# Altium schematic symbol library Capacitor - Ceramic - Sumsung.SchLib: 1421 symbols (part 1 of 8) (continued)
## CL03B152KP3NNNC (continued)
CAP CER 1500PF 10V X7R 0201; Part Number: CL03B152KP3NNNC; Manufacturer: Samsung Electro-Mechanics America, Inc.; TemperatureRange: -55C ~ 125C; Tolerance: 10%; Value: 1500pF; PartId: 21049; Supplier 1: Digi-Key; Supplier Part Number 1: 1276-1346-2-ND; ComponentLink1Description: Datasheet; ComponentLink1URL: http://www.samsungsem.com/kr/support/product-search/mlcc/__icsFiles/afieldfile/2016/08/18/S_CL03B152KP3NNNC.pdf; ComponentLink2Description: Digi-Key Listing; ComponentLink2URL: https://www.digikey.com/product-detail/en/samsung-electro-mechanics-america-inc/CL03B152KP3NNNC/1276-1346-2-ND/3887004; TemperatureCoefficient: X7R; Voltage: 10V; Price: 0.003; Device Package: 0201 (0603 Metric)
footprint CAP 0201/0603
pins: 1, 2

## CL03B221KA3NNNC
designator C?, comment 220pF
CAP CER 220PF 25V X7R 0201; Part Number: CL03B221KA3NNNC; Manufacturer: Samsung Electro-Mechanics America, Inc.; TemperatureRange: -55C ~ 125C; Tolerance: 10%; Value: 220pF; PartId: 21027; Supplier 1: Digi-Key; Supplier Part Number 1: 1276-1347-2-ND; ComponentLink1Description: Datasheet; ComponentLink1URL: http://www.samsungsem.com/kr/support/product-search/mlcc/__icsFiles/afieldfile/2016/08/18/S_CL03B221KA3NNNC.pdf; ComponentLink2Description: Digi-Key Listing; ComponentLink2URL: https://www.digikey.com/product-detail/en/samsung-electro-mechanics-america-inc/CL03B221KA3NNNC/1276-1347-2-ND/3887005; TemperatureCoefficient: X7R; Voltage: 25V; Price: 0.0044; Device Package: 0201 (0603 Metric)
footprint CAP 0201/0603
pins: 1, 2

## CL03B221KO3NNNC
designator C?, comment 220pF
CAP CER 220PF 16V X7R 0201; Part Number: CL03B221KO3NNNC; Manufacturer: Samsung Electro-Mechanics America, Inc.; TemperatureRange: -55C ~ 125C; Tolerance: 10%; Value: 220pF; PartId: 21076; Supplier 1: Digi-Key; Supplier Part Number 1: 1276-1348-2-ND; ComponentLink1Description: Datasheet; ComponentLink1URL: http://www.samsungsem.com/kr/support/product-search/mlcc/__icsFiles/afieldfile/2016/08/18/S_CL03B221KO3NNNC.pdf; ComponentLink2Description: Digi-Key Listing; ComponentLink2URL: https://www.digikey.com/product-detail/en/samsung-electro-mechanics-america-inc/CL03B221KO3NNNC/1276-1348-2-ND/3887006; TemperatureCoefficient: X7R; Voltage: 16V; Price: 0.0044; Device Package: 0201 (0603 Metric)
footprint CAP 0201/0603
pins: 1, 2

## CL03B222KP3NNNC
designator C?, comment 2200pF
CAP CER 2200PF 10V X7R 0201; Part Number: CL03B222KP3NNNC; Manufacturer: Samsung Electro-Mechanics America, Inc.; TemperatureRange: -55C ~ 125C; Tolerance: 10%; Value: 2200pF; PartId: 20753; Supplier 1: Digi-Key; Supplier Part Number 1: 1276-1349-2-ND; ComponentLink1Description: Datasheet; ComponentLink1URL: http://www.samsungsem.com/kr/support/product-search/mlcc/__icsFiles/afieldfile/2016/08/18/S_CL03B222KP3NNNC.pdf; ComponentLink2Description: Digi-Key Listing; ComponentLink2URL: https://www.digikey.com/product-detail/en/samsung-electro-mechanics-america-inc/CL03B222KP3NNNC/1276-1349-2-ND/3887007; TemperatureCoefficient: X7R; Voltage: 10V; Price: 0.0044; Device Package: 0201 (0603 Metric)
footprint CAP 0201/0603
pins: 1, 2

## CL03B271KO3NNNC
designator C?, comment 270pF
CAP CER 270PF 16V X7R 0201; Part Number: CL03B271KO3NNNC; Manufacturer: Samsung Electro-Mechanics America, Inc.; TemperatureRange: -55C ~ 125C; Tolerance: 10%; Value: 270pF; PartId: 21071; Supplier 1: Digi-Key; Supplier Part Number 1: 1276-1350-2-ND; ComponentLink1Description: Datasheet; ComponentLink1URL: http://www.samsungsem.com/kr/support/product-search/mlcc/__icsFiles/afieldfile/2016/08/18/S_CL03B271KO3NNNC.pdf; ComponentLink2Description: Digi-Key Listing; ComponentLink2URL: https://www.digikey.com/product-detail/en/samsung-electro-mechanics-america-inc/CL03B271KO3NNNC/1276-1350-2-ND/3887008; TemperatureCoefficient: X7R; Voltage: 16V; Price: 0.0044; Device Package: 0201 (0603 Metric)
footprint CAP 0201/0603
pins: 1, 2

## CL03B331KA3NNNC
designator C?, comment 330pF
CAP CER 330PF 25V X7R 0201; Part Number: CL03B331KA3NNNC; Manufacturer: Samsung Electro-Mechanics; TemperatureRange: -55C ~ 125C; Tolerance: 10%; Value: 330pF; PartId: 30134; Supplier 1: Digi-Key; Supplier Part Number 1: 1276-1351-2-ND; ComponentLink1Description: Datasheet; ComponentLink1URL: http://www.samsungsem.com/kr/support/product-search/mlcc/CL03B331KA3NNNC.jsp; ComponentLink2Description: Digi-Key Listing; ComponentLink2URL: https://www.digikey.com/product-detail/en/samsung-electro-mechanics/CL03B331KA3NNNC/1276-1351-2-ND/3887009; TemperatureCoefficient: X7R; Voltage: 25V; Price: 0; Device Package: 0201 (0603 Metric)
footprint CAP 0201/0603
pins: 1, 2

## CL03B331KO3NNNC
designator C?, comment 330pF
CAP CER 330PF 16V X7R 0201; Part Number: CL03B331KO3NNNC; Manufacturer: Samsung Electro-Mechanics America, Inc.; TemperatureRange: -55C ~ 125C; Tolerance: 10%; Value: 330pF; PartId: 21068; Supplier 1: Digi-Key; Supplier Part Number 1: 1276-1352-2-ND; ComponentLink1Description: Datasheet; ComponentLink1URL: http://www.samsungsem.com/kr/support/product-search/mlcc/__icsFiles/afieldfile/2016/08/18/S_CL03B331KO3NNNC.pdf; ComponentLink2Description: Digi-Key Listing; ComponentLink2URL: https://www.digikey.com/product-detail/en/samsung-electro-mechanics-america-inc/CL03B331KO3NNNC/1276-1352-2-ND/3887010; TemperatureCoefficient: X7R; Voltage: 16V; Price: 0.0039; Device Package: 0201 (0603 Metric)
footprint CAP 0201/0603
pins: 1, 2

## CL03B471KO3NNNC
designator C?, comment 470pF
CAP CER 470PF 16V X7R 0201; Part Number: CL03B471KO3NNNC; Manufacturer: Samsung Electro-Mechanics America, Inc.; TemperatureRange: -55C ~ 125C; Tolerance: 10%; Value: 470pF; PartId: 20754; Supplier 1: Digi-Key; Supplier Part Number 1: 1276-1354-2-ND; ComponentLink1Description: Datasheet; ComponentLink1URL: http://www.samsungsem.com/kr/support/product-search/mlcc/__icsFiles/afieldfile/2016/08/18/S_CL03B471KO3NNNC.pdf; ComponentLink2Description: Digi-Key Listing; ComponentLink2URL: https://www.digikey.com/product-detail/en/samsung-electro-mechanics-america-inc/CL03B471KO3NNNC/1276-1354-2-ND/3887012; TemperatureCoefficient: X7R; Voltage: 16V; Price: 0.0044; Device Package: 0201 (0603 Metric)
footprint CAP 0201/0603
pins: 1, 2

## CL03B472KP3NNNC
designator C?, comment 4700pF
CAP CER 4700PF 10V X7R 0201; Part Number: CL03B472KP3NNNC; Manufacturer: Samsung Electro-Mechanics America, Inc.; TemperatureRange: -55C ~ 125C; Tolerance: 10%; Value: 4700pF; PartId: 20755; Supplier 1: Digi-Key; Supplier Part Number 1: 1276-1355-2-ND; ComponentLink1Description: Datasheet; ComponentLink1URL: http://www.samsungsem.com/kr/support/product-search/mlcc/__icsFiles/afieldfile/2016/08/18/S_CL03B472KP3NNNC.pdf; ComponentLink2Description: Digi-Key Listing; ComponentLink2URL: https://www.digikey.com/product-detail/en/samsung-electro-mechanics-america-inc/CL03B472KP3NNNC/1276-1355-2-ND/3887013; TemperatureCoefficient: X7R; Voltage: 10V; Price: 0.0044; Device Package: 0201 (0603 Metric)
footprint CAP 0201/0603
pins: 1, 2

## CL03B472KQ3NNNC
designator C?, comment 4700pF
CAP CER 4700PF 6.3V X7R 0201; Part Number: CL03B472KQ3NNNC; Manufacturer: Samsung Electro-Mechanics America, Inc.; TemperatureRange: -55C ~ 125C; Tolerance: 10%; Value: 4700pF; PartId: 21053; Supplier 1: Digi-Key; Supplier Part Number 1: 1276-1356-2-ND; ComponentLink1Description: Datasheet; ComponentLink1URL: http://www.samsungsem.com/kr/support/product-search/mlcc/__icsFiles/afieldfile/2016/08/18/S_CL03B472KQ3NNNC.pdf; ComponentLink2Description: Digi-Key Listing; ComponentLink2URL: https://www.digikey.com/product-detail/en/samsung-electro-mechanics-america-inc/CL03B472KQ3NNNC/1276-1356-2-ND/3887014; TemperatureCoefficient: X7R; Voltage: 6.3V; Price: 0.0036; Device Package: 0201 (0603 Metric)
footprint CAP 0201/0603
pins: 1, 2

## CL03B561KO3NNNC
designator C?, comment 560pF
CAP CER 560PF 16V X7R 0201; Part Number: CL03B561KO3NNNC; Manufacturer: Samsung Electro-Mechanics America, Inc.; TemperatureRange: -55C ~ 125C; Tolerance: 10%; Value: 560pF; PartId: 20606; Supplier 1: Digi-Key; Supplier Part Number 1: 1276-1357-2-ND; ComponentLink1Description: Datasheet; ComponentLink1URL: http://www.samsungsem.com/kr/support/product-search/mlcc/__icsFiles/afieldfile/2016/08/18/S_CL03B561KO3NNNC.pdf; ComponentLink2Description: Digi-Key Listing; ComponentLink2URL: https://www.digikey.com/product-detail/en/samsung-electro-mechanics-america-inc/CL03B561KO3NNNC/1276-1357-2-ND/3887015; TemperatureCoefficient: X7R; Voltage: 16V; Price: 0.0044; Device Package: 0201 (0603 Metric)
footprint CAP 0201/0603
pins: 1, 2

## CL03B682KP3NNNC
designator C?, comment 6800pF
CAP CER 6800PF 10V X7R 0201; Part Number: CL03B682KP3NNNC; Manufacturer: Samsung Electro-Mechanics America, Inc.; TemperatureRange: -55C ~ 125C; Tolerance: 10%; Value: 6800pF; PartId: 21069; Supplier 1: Digi-Key; Supplier Part Number 1: 1276-1358-2-ND; ComponentLink1Description: Datasheet; ComponentLink1URL: http://www.samsungsem.com/kr/support/product-search/mlcc/__icsFiles/afieldfile/2016/08/18/S_CL03B682KP3NNNC.pdf; ComponentLink2Description: Digi-Key Listing; ComponentLink2URL: https://www.digikey.com/product-detail/en/samsung-electro-mechanics-america-inc/CL03B682KP3NNNC/1276-1358-2-ND/3887016; TemperatureCoefficient: X7R; Voltage: 10V; Price: 0.0044; Device Package: 0201 (0603 Metric)
footprint CAP 0201/0603
pins: 1, 2

## CL03B821KO3NNNC
designator C?, comment 820pF
CAP CER 820PF 16V X7R 0201; Part Number: CL03B821KO3NNNC; Manufacturer: Samsung Electro-Mechanics America, Inc.; TemperatureRange: -55C ~ 125C; Tolerance: 10%; Value: 820pF; PartId: 20756; Supplier 1: Digi-Key; Supplier Part Number 1: 1276-1360-2-ND; ComponentLink1Description: Datasheet; ComponentLink1URL: http://www.samsungsem.com/kr/support/product-search/mlcc/__icsFiles/afieldfile/2016/08/18/S_CL03B821KO3NNNC.pdf; ComponentLink2Description: Digi-Key Listing; ComponentLink2URL: https://www.digikey.com/product-detail/en/samsung-electro-mechanics-america-inc/CL03B821KO3NNNC/1276-1360-2-ND/3887018; TemperatureCoefficient: X7R; Voltage: 16V; Price: 0.0044; Device Package: 0201 (0603 Metric)
footprint CAP 0201/0603
pins: 1, 2

## CL03C0R3BA3GNNC
designator C?, comment 0.30pF
CAP CER 0.3PF 25V NP0 0201; Part Number: CL03C0R3BA3GNNC; Manufacturer: Samsung Electro-Mechanics America, Inc.; TemperatureRange: -55C ~ 125C; TemperatureCoefficient: C0G, NP0; Tolerance: 0.1pF; Value: 0.30pF; PartId: 20786; Supplier 1: Digi-Key; Supplier Part Number 1: 1276-1375-2-ND; ComponentLink1Description: Datasheet; ComponentLink1URL: http://www.samsungsem.com/kr/support/product-search/mlcc/__icsFiles/afieldfile/2016/08/18/S_CL03C0R3BA3GNNC.pdf; ComponentLink2Description: Digi-Key Listing; ComponentLink2URL: https://www.digikey.com/product-detail/en/samsung-electro-mechanics-america-inc/CL03C0R3BA3GNNC/1276-1375-2-ND/3887033; Voltage: 25V; Price: 0.0063; Device Package: 0201 (0603 Metric)
footprint CAP 0201/0603
pins: 1, 2

## CL03C0R4BA3GNNC
designator C?, comment 0.40pF
CAP CER 0.4PF 25V NP0 0201; Part Number: CL03C0R4BA3GNNC; Manufacturer: Samsung Electro-Mechanics America, Inc.; TemperatureRange: -55C ~ 125C; TemperatureCoefficient: C0G, NP0; Tolerance: 0.1pF; Value: 0.40pF; PartId: 21061; Supplier 1: Digi-Key; Supplier Part Number 1: 1276-1376-2-ND; ComponentLink1Description: Datasheet; ComponentLink1URL: http://www.samsungsem.com/kr/support/product-search/mlcc/__icsFiles/afieldfile/2016/08/18/S_CL03C0R4BA3GNNC.pdf; ComponentLink2Description: Digi-Key Listing; ComponentLink2URL: https://www.digikey.com/product-detail/en/samsung-electro-mechanics-america-inc/CL03C0R4BA3GNNC/1276-1376-2-ND/3887034; Voltage: 25V; Price: 0.0063; Device Package: 0201 (0603 Metric)
footprint CAP 0201/0603
pins: 1, 2

## CL03C0R5BA3GNNC
designator C?, comment 0.50pF
CAP CER 0.5PF 25V NP0 0201; Part Number: CL03C0R5BA3GNNC; Manufacturer: Samsung Electro-Mechanics America, Inc.; TemperatureRange: -55C ~ 125C; TemperatureCoefficient: C0G, NP0; Tolerance: 0.1pF; Value: 0.50pF; PartId: 20787; Supplier 1: Digi-Key; Supplier Part Number 1: 1276-1377-2-ND; ComponentLink1Description: Datasheet; ComponentLink1URL: http://www.samsungsem.com/kr/support/product-search/mlcc/__icsFiles/afieldfile/2016/08/18/S_CL03C0R5BA3GNNC.pdf; ComponentLink2Description: Digi-Key Listing; ComponentLink2URL: https://www.digikey.com/product-detail/en/samsung-electro-mechanics-america-inc/CL03C0R5BA3GNNC/1276-1377-2-ND/3887035; Voltage: 25V; Price: 0.0063; Device Package: 0201 (0603 Metric)
footprint CAP 0201/0603
pins: 1, 2

## CL03C0R5CA3GNNC
designator C?, comment 0.50pF
CAP CER 0.5PF 25V NP0 0201; Part Number: CL03C0R5CA3GNNC; Manufacturer: Samsung Electro-Mechanics America, Inc.; TemperatureRange: -55C ~ 125C; TemperatureCoefficient: C0G, NP0; Tolerance: 0.25pF; Value: 0.50pF; PartId: 21040; Supplier 1: Digi-Key; Supplier Part Number 1: 1276-6543-2-ND; ComponentLink1Description: Datasheet; ComponentLink1URL: http://www.samsungsem.com/kr/support/product-search/mlcc/__icsFiles/afieldfile/2016/08/18/S_CL03C0R5CA3GNNC.pdf; ComponentLink2Description: Digi-Key Listing; ComponentLink2URL: https://www.digikey.com/product-detail/en/samsung-electro-mechanics-america-inc/CL03C0R5CA3GNNC/1276-6543-2-ND/5961027; Voltage: 25V; Price: 0.0018; Device Package: 0201 (0603 Metric)
footprint CAP 0201/0603
pins: 1, 2

## CL03C0R6BA3GNNC
designator C?, comment 0.60pF
CAP CER 0.6PF 25V NP0 0201; Part Number: CL03C0R6BA3GNNC; Manufacturer: Samsung Electro-Mechanics America, Inc.; TemperatureRange: -55C ~ 125C; TemperatureCoefficient: C0G, NP0; Tolerance: 0.1pF; Value: 0.60pF; PartId: 20788; Supplier 1: Digi-Key; Supplier Part Number 1: 1276-1378-2-ND; ComponentLink1Description: Datasheet; ComponentLink1URL: http://www.samsungsem.com/kr/support/product-search/mlcc/__icsFiles/afieldfile/2016/08/18/S_CL03C0R6BA3GNNC.pdf; ComponentLink2Description: Digi-Key Listing; ComponentLink2URL: https://www.digikey.com/product-detail/en/samsung-electro-mechanics-america-inc/CL03C0R6BA3GNNC/1276-1378-2-ND/3887036; Voltage: 25V; Price: 0.0063; Device Package: 0201 (0603 Metric)
footprint CAP 0201/0603
pins: 1, 2

## CL03C0R7BA3GNNC
designator C?, comment 0.70pF
CAP CER 0.7PF 25V NP0 0201; Part Number: CL03C0R7BA3GNNC; Manufacturer: Samsung Electro-Mechanics America, Inc.; TemperatureRange: -55C ~ 125C; TemperatureCoefficient: C0G, NP0; Tolerance: 0.1pF; Value: 0.70pF; PartId: 21052; Supplier 1: Digi-Key; Supplier Part Number 1: 1276-1379-2-ND; ComponentLink1Description: Datasheet; ComponentLink1URL: http://www.samsungsem.com/kr/support/product-search/mlcc/__icsFiles/afieldfile/2016/08/18/S_CL03C0R7BA3GNNC.pdf; ComponentLink2Description: Digi-Key Listing; ComponentLink2URL: https://www.digikey.com/product-detail/en/samsung-electro-mechanics-america-inc/CL03C0R7BA3GNNC/1276-1379-2-ND/3887037; Voltage: 25V; Price: 0.0063; Device Package: 0201 (0603 Metric)
footprint CAP 0201/0603
pins: 1, 2

## CL03C0R8CA3GNNC
designator C?, comment 0.80pF
CAP CER 0.8PF 25V NP0 0201; Part Number: CL03C0R8CA3GNNC; Manufacturer: Samsung Electro-Mechanics America, Inc.; TemperatureRange: -55C ~ 125C; TemperatureCoefficient: C0G, NP0; Tolerance: 0.25pF; Value: 0.80pF; PartId: 21066; Supplier 1: Digi-Key; Supplier Part Number 1: 1276-1381-2-ND; ComponentLink1Description: Datasheet; ComponentLink1URL: http://www.samsungsem.com/kr/support/product-search/mlcc/__icsFiles/afieldfile/2016/08/18/S_CL03C0R8CA3GNNC.pdf; ComponentLink2Description: Digi-Key Listing; ComponentLink2URL: https://www.digikey.com/product-detail/en/samsung-electro-mechanics-america-inc/CL03C0R8CA3GNNC/1276-1381-2-ND/3887039; Voltage: 25V; Price: 0.0033; Device Package: 0201 (0603 Metric)
footprint CAP 0201/0603
pins: 1, 2

## CL03C0R9BA3GNNC
designator C?, comment 0.90pF
CAP CER 0.9PF 25V NP0 0201; Part Number: CL03C0R9BA3GNNC; Manufacturer: Samsung Electro-Mechanics America, Inc.; TemperatureRange: -55C ~ 125C; TemperatureCoefficient: C0G, NP0; Tolerance: 0.1pF; Value: 0.90pF; PartId: 21050; Supplier 1: Digi-Key; Supplier Part Number 1: 1276-1382-2-ND; ComponentLink1Description: Datasheet; ComponentLink1URL: http://www.samsungsem.com/kr/support/product-search/mlcc/__icsFiles/afieldfile/2016/08/18/S_CL03C0R9BA3GNNC.pdf; ComponentLink2Description: Digi-Key Listing; ComponentLink2URL: https://www.digikey.com/product-detail/en/samsung-electro-mechanics-america-inc/CL03C0R9BA3GNNC/1276-1382-2-ND/3887040; Voltage: 25V; Price: 0.0063; Device Package: 0201 (0603 Metric)
footprint CAP 0201/0603
pins: 1, 2

## CL03C1R1BA3GNNC
designator C?, comment 1.1pF
CAP CER 1.1PF 25V C0G/NP0 0201; Part Number: CL03C1R1BA3GNNC; Manufacturer: Samsung Electro-Mechanics; TemperatureRange: -55C ~ 125C; TemperatureCoefficient: C0G, NP0; Tolerance: 0.1pF; Value: 1.1pF; PartId: 30087; Supplier 1: Digi-Key; Supplier Part Number 1: 1276-6502-2-ND; ComponentLink1Description: Datasheet; ComponentLink1URL: http://www.samsungsem.com/kr/support/product-search/mlcc/CL03C1R1BA3GNNC.jsp; ComponentLink2Description: Digi-Key Listing; ComponentLink2URL: https://www.digikey.com/product-detail/en/samsung-electro-mechanics/CL03C1R1BA3GNNC/1276-6502-2-ND/5960986; Voltage: 25V; Price: 0; Device Package: 0201 (0603 Metric)
footprint CAP 0201/0603
pins: 1, 2

## CL03C1R2BA3GNNC
designator C?, comment 1.2pF
CAP CER 1.2PF 25V NP0 0201; Part Number: CL03C1R2BA3GNNC; Manufacturer: Samsung Electro-Mechanics America, Inc.; TemperatureRange: -55C ~ 125C; TemperatureCoefficient: C0G, NP0; Tolerance: 0.1pF; Value: 1.2pF; PartId: 21060; Supplier 1: Digi-Key; Supplier Part Number 1: 1276-1392-2-ND; ComponentLink1Description: Datasheet; ComponentLink1URL: http://www.samsungsem.com/kr/support/product-search/mlcc/__icsFiles/afieldfile/2016/08/18/S_CL03C1R2BA3GNNC.pdf; ComponentLink2Description: Digi-Key Listing; ComponentLink2URL: https://www.digikey.com/product-detail/en/samsung-electro-mechanics-america-inc/CL03C1R2BA3GNNC/1276-1392-2-ND/3887050; Voltage: 25V; Price: 0.0063; Device Package: 0201 (0603 Metric)
footprint CAP 0201/0603
pins: 1, 2

## CL03C1R2CA3GNNC
designator C?, comment 1.2pF
CAP CER 1.2PF 25V NP0 0201; Part Number: CL03C1R2CA3GNNC; Manufacturer: Samsung Electro-Mechanics America, Inc.; TemperatureRange: -55C ~ 125C; TemperatureCoefficient: C0G, NP0; Tolerance: 0.25pF; Value: 1.2pF; PartId: 20733; Supplier 1: Digi-Key; Supplier Part Number 1: 1276-1393-2-ND; ComponentLink1Description: Datasheet; ComponentLink1URL: http://www.samsungsem.com/kr/support/product-search/mlcc/__icsFiles/afieldfile/2016/08/18/S_CL03C1R2CA3GNNC.pdf; ComponentLink2Description: Digi-Key Listing; ComponentLink2URL: https://www.digikey.com/product-detail/en/samsung-electro-mechanics-america-inc/CL03C1R2CA3GNNC/1276-1393-2-ND/3887051; Voltage: 25V; Price: 0.0039; Device Package: 0201 (0603 Metric)
footprint CAP 0201/0603
pins: 1, 2

## CL03C1R3BA3GNNC
designator C?, comment 1.3pF
CAP CER 1.3PF 25V NP0 0201; Part Number: CL03C1R3BA3GNNC; Manufacturer: Samsung Electro-Mechanics America, Inc.; TemperatureRange: -55C ~ 125C; TemperatureCoefficient: C0G, NP0; Tolerance: 0.1pF; Value: 1.3pF; PartId: 21073; Supplier 1: Digi-Key; Supplier Part Number 1: 1276-1394-2-ND; ComponentLink1Description: Datasheet; ComponentLink1URL: http://www.samsungsem.com/kr/support/product-search/mlcc/__icsFiles/afieldfile/2016/08/18/S_CL03C1R3BA3GNNC.pdf; ComponentLink2Description: Digi-Key Listing; ComponentLink2URL: https://www.digikey.com/product-detail/en/samsung-electro-mechanics-america-inc/CL03C1R3BA3GNNC/1276-1394-2-ND/3887052; Voltage: 25V; Price: 0.0063; Device Package: 0201 (0603 Metric)
footprint CAP 0201/0603
pins: 1, 2

## CL03C1R5BA3GNNC
designator C?, comment 1.5pF
CAP CER 1.5PF 25V NP0 0201; Part Number: CL03C1R5BA3GNNC; Manufacturer: Samsung Electro-Mechanics America, Inc.; TemperatureRange: -55C ~ 125C; TemperatureCoefficient: C0G, NP0; Tolerance: 0.1pF; Value: 1.5pF; PartId: 20789; Supplier 1: Digi-Key; Supplier Part Number 1: 1276-1395-2-ND; ComponentLink1Description: Datasheet; ComponentLink1URL: http://www.samsungsem.com/kr/support/product-search/mlcc/__icsFiles/afieldfile/2016/08/18/S_CL03C1R5BA3GNNC.pdf; ComponentLink2Description: Digi-Key Listing; ComponentLink2URL: https://www.digikey.com/product-detail/en/samsung-electro-mechanics-america-inc/CL03C1R5BA3GNNC/1276-1395-2-ND/3887053; Voltage: 25V; Price: 0.0063; Device Package: 0201 (0603 Metric)
footprint CAP 0201/0603
pins: 1, 2

## CL03C1R5CA3GNNC
designator C?, comment 1.5pF
CAP CER 1.5PF 25V NP0 0201; Part Number: CL03C1R5CA3GNNC; Manufacturer: Samsung Electro-Mechanics America, Inc.; TemperatureRange: -55C ~ 125C; TemperatureCoefficient: C0G, NP0; Tolerance: 0.25pF; Value: 1.5pF; PartId: 21086; Supplier 1: Digi-Key; Supplier Part Number 1: 1276-1396-2-ND; ComponentLink1Description: Datasheet; ComponentLink1URL: http://www.samsungsem.com/kr/support/product-search/mlcc/__icsFiles/afieldfile/2016/08/18/S_CL03C1R5CA3GNNC.pdf; ComponentLink2Description: Digi-Key Listing; ComponentLink2URL: https://www.digikey.com/product-detail/en/samsung-electro-mechanics-america-inc/CL03C1R5CA3GNNC/1276-1396-2-ND/3887054; Voltage: 25V; Price: 0.0039; Device Package: 0201 (0603 Metric)
footprint CAP 0201/0603
pins: 1, 2

## CL03C1R8BA3GNNC
designator C?, comment 1.8pF
CAP CER 1.8PF 25V NP0 0201; Part Number: CL03C1R8BA3GNNC; Manufacturer: Samsung Electro-Mechanics America, Inc.; TemperatureRange: -55C ~ 125C; TemperatureCoefficient: C0G, NP0; Tolerance: 0.1pF; Value: 1.8pF; PartId: 21044; Supplier 1: Digi-Key; Supplier Part Number 1: 1276-1399-2-ND; ComponentLink1Description: Datasheet; ComponentLink1URL: http://www.samsungsem.com/kr/support/product-search/mlcc/__icsFiles/afieldfile/2016/08/18/S_CL03C1R8BA3GNNC.pdf; ComponentLink2Description: Digi-Key Listing; ComponentLink2URL: https://www.digikey.com/product-detail/en/samsung-electro-mechanics-america-inc/CL03C1R8BA3GNNC/1276-1399-2-ND/3887057; Voltage: 25V; Price: 0.0063; Device Package: 0201 (0603 Metric)
footprint CAP 0201/0603
pins: 1, 2

## CL03C1R8CA3GNNC
designator C?, comment 1.8pF
CAP CER 1.8PF 25V NP0 0201; Part Number: CL03C1R8CA3GNNC; Manufacturer: Samsung Electro-Mechanics America, Inc.; TemperatureRange: -55C ~ 125C; TemperatureCoefficient: C0G, NP0; Tolerance: 0.25pF; Value: 1.8pF; PartId: 21051; Supplier 1: Digi-Key; Supplier Part Number 1: 1276-1400-2-ND; ComponentLink1Description: Datasheet; ComponentLink1URL: http://www.samsungsem.com/kr/support/product-search/mlcc/__icsFiles/afieldfile/2016/08/18/S_CL03C1R8CA3GNNC.pdf; ComponentLink2Description: Digi-Key Listing; ComponentLink2URL: https://www.digikey.com/product-detail/en/samsung-electro-mechanics-america-inc/CL03C1R8CA3GNNC/1276-1400-2-ND/3887058; Voltage: 25V; Price: 0.0039; Device Package: 0201 (0603 Metric)
footprint CAP 0201/0603
pins: 1, 2

## CL03C2R2BA3GNNC
designator C?, comment 2.2pF
CAP CER 2.2PF 25V NP0 0201; Part Number: CL03C2R2BA3GNNC; Manufacturer: Samsung Electro-Mechanics America, Inc.; TemperatureRange: -55C ~ 125C; TemperatureCoefficient: C0G, NP0; Tolerance: 0.1pF; Value: 2.2pF; PartId: 21083; Supplier 1: Digi-Key; Supplier Part Number 1: 1276-1403-2-ND; ComponentLink1Description: Datasheet; ComponentLink1URL: http://www.samsungsem.com/kr/support/product-search/mlcc/__icsFiles/afieldfile/2016/08/18/S_CL03C2R2BA3GNNC.pdf; ComponentLink2Description: Digi-Key Listing; ComponentLink2URL: https://www.digikey.com/product-detail/en/samsung-electro-mechanics-america-inc/CL03C2R2BA3GNNC/1276-1403-2-ND/3887061; Voltage: 25V; Price: 0.0063; Device Package: 0201 (0603 Metric)
footprint CAP 0201/0603
pins: 1, 2

## CL03C2R2BA3GNNH
designator C?, comment 2.2pF
CAP CER 2.2PF 25V NP0 0201; Part Number: CL03C2R2BA3GNNH; Manufacturer: Samsung Electro-Mechanics America, Inc.; TemperatureRange: -55C ~ 125C; TemperatureCoefficient: C0G, NP0; Tolerance: 0.1pF; Value: 2.2pF; PartId: 20988; Supplier 1: Digi-Key; Supplier Part Number 1: 1276-6449-2-ND; ComponentLink1Description: Datasheet; ComponentLink1URL: http://www.samsungsem.com/kr/support/product-search/mlcc/__icsFiles/afieldfile/2016/08/18/S_CL03C2R2BA3GNNH.pdf; ComponentLink2Description: Digi-Key Listing; ComponentLink2URL: https://www.digikey.com/product-detail/en/samsung-electro-mechanics-america-inc/CL03C2R2BA3GNNH/1276-6449-2-ND/3894150; Voltage: 25V; Price: 0.0034; Device Package: 0201 (0603 Metric)
footprint CAP 0201/0603
pins: 1, 2

## CL03C2R2CA3GNNC
designator C?, comment 2.2pF
CAP CER 2.2PF 25V NP0 0201; Part Number: CL03C2R2CA3GNNC; Manufacturer: Samsung Electro-Mechanics America, Inc.; TemperatureRange: -55C ~ 125C; TemperatureCoefficient: C0G, NP0; Tolerance: 0.25pF; Value: 2.2pF; PartId: 20734; Supplier 1: Digi-Key; Supplier Part Number 1: 1276-1404-2-ND; ComponentLink1Description: Datasheet; ComponentLink1URL: http://www.samsungsem.com/kr/support/product-search/mlcc/__icsFiles/afieldfile/2016/08/18/S_CL03C2R2CA3GNNC.pdf; ComponentLink2Description: Digi-Key Listing; ComponentLink2URL: https://www.digikey.com/product-detail/en/samsung-electro-mechanics-america-inc/CL03C2R2CA3GNNC/1276-1404-2-ND/3887062; Voltage: 25V; Price: 0.0039; Device Package: 0201 (0603 Metric)
footprint CAP 0201/0603
pins: 1, 2

## CL03C2R4BA3GNNC
designator C?, comment 2.4pF
CAP CER 2.4PF 25V NP0 0201; Part Number: CL03C2R4BA3GNNC; Manufacturer: Samsung Electro-Mechanics America, Inc.; TemperatureRange: -55C ~ 125C; TemperatureCoefficient: C0G, NP0; Tolerance: 0.1pF; Value: 2.4pF; PartId: 21077; Supplier 1: Digi-Key; Supplier Part Number 1: 1276-1405-2-ND; ComponentLink1Description: Datasheet; ComponentLink1URL: http://www.samsungsem.com/kr/support/product-search/mlcc/__icsFiles/afieldfile/2016/08/18/S_CL03C2R4BA3GNNC.pdf; ComponentLink2Description: Digi-Key Listing; ComponentLink2URL: https://www.digikey.com/product-detail/en/samsung-electro-mechanics-america-inc/CL03C2R4BA3GNNC/1276-1405-2-ND/3887063; Voltage: 25V; Price: 0.0063; Device Package: 0201 (0603 Metric)
footprint CAP 0201/0603
pins: 1, 2

## CL03C2R4CA3GNNC
designator C?, comment 2.4pF
CAP CER 2.4PF 25V NP0 0201; Part Number: CL03C2R4CA3GNNC; Manufacturer: Samsung Electro-Mechanics America, Inc.; TemperatureRange: -55C ~ 125C; TemperatureCoefficient: C0G, NP0; Tolerance: 0.25pF; Value: 2.4pF; PartId: 21055; Supplier 1: Digi-Key; Supplier Part Number 1: 1276-1406-2-ND; ComponentLink1Description: Datasheet; ComponentLink1URL: http://www.samsungsem.com/kr/support/product-search/mlcc/__icsFiles/afieldfile/2016/08/18/S_CL03C2R4CA3GNNC.pdf; ComponentLink2Description: Digi-Key Listing; ComponentLink2URL: https://www.digikey.com/product-detail/en/samsung-electro-mechanics-america-inc/CL03C2R4CA3GNNC/1276-1406-2-ND/3887064; Voltage: 25V; Price: 0.0033; Device Package: 0201 (0603 Metric)
footprint CAP 0201/0603
pins: 1, 2

## CL03C2R6BA3GNNC
designator C?, comment 2.6pF
CAP CER 2.6PF 25V NP0 0201; Part Number: CL03C2R6BA3GNNC; Manufacturer: Samsung Electro-Mechanics America, Inc.; TemperatureRange: -55C ~ 125C; TemperatureCoefficient: C0G, NP0; Tolerance: 0.1pF; Value: 2.6pF; PartId: 21080; Supplier 1: Digi-Key; Supplier Part Number 1: 1276-6623-2-ND; ComponentLink1Description: Datasheet; ComponentLink1URL: http://www.samsungsem.com/kr/support/product-search/mlcc/__icsFiles/afieldfile/2016/08/18/S_CL03C2R6BA3GNNC.pdf; ComponentLink2Description: Digi-Key Listing; ComponentLink2URL: https://www.digikey.com/product-detail/en/samsung-electro-mechanics-america-inc/CL03C2R6BA3GNNC/1276-6623-2-ND/5961107; Voltage: 25V; Price: 0.0039; Device Package: 0201 (0603 Metric)
footprint CAP 0201/0603
pins: 1, 2

## CL03C2R7BA3GNNC
designator C?, comment 2.7pF
CAP CER 2.7PF 25V NP0 0201; Part Number: CL03C2R7BA3GNNC; Manufacturer: Samsung Electro-Mechanics America, Inc.; TemperatureRange: -55C ~ 125C; TemperatureCoefficient: C0G, NP0; Tolerance: 0.1pF; Value: 2.7pF; PartId: 21028; Supplier 1: Digi-Key; Supplier Part Number 1: 1276-1407-2-ND; ComponentLink1Description: Datasheet; ComponentLink1URL: http://www.samsungsem.com/kr/support/product-search/mlcc/__icsFiles/afieldfile/2016/08/18/S_CL03C2R7BA3GNNC.pdf; ComponentLink2Description: Digi-Key Listing; ComponentLink2URL: https://www.digikey.com/product-detail/en/samsung-electro-mechanics-america-inc/CL03C2R7BA3GNNC/1276-1407-2-ND/3887065; Voltage: 25V; Price: 0.0063; Device Package: 0201 (0603 Metric)
footprint CAP 0201/0603
pins: 1, 2

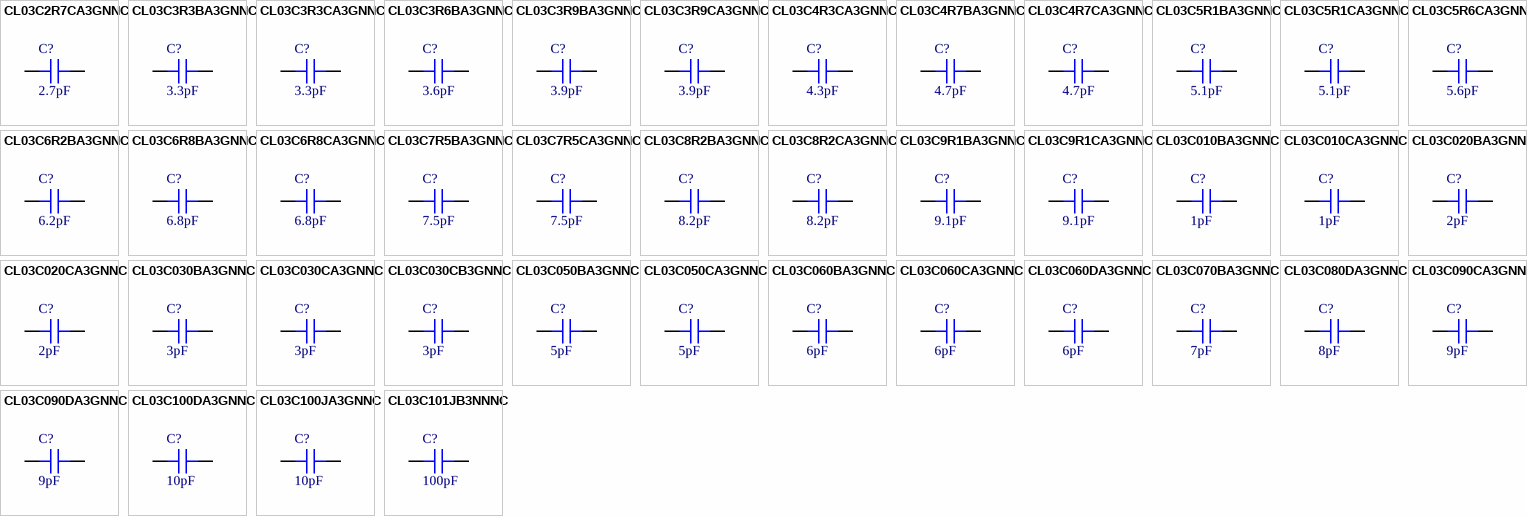
[diagram p2: symbols CL03C2R7CA3GNNC to CL03C101JB3NNNC]

## CL03C2R7CA3GNNC
designator C?, comment 2.7pF
CAP CER 2.7PF 25V NP0 0201; Part Number: CL03C2R7CA3GNNC; Manufacturer: Samsung Electro-Mechanics America, Inc.; TemperatureRange: -55C ~ 125C; TemperatureCoefficient: C0G, NP0; Tolerance: 0.25pF; Value: 2.7pF; PartId: 20730; Supplier 1: Digi-Key; Supplier Part Number 1: 1276-1408-2-ND; ComponentLink1Description: Datasheet; ComponentLink1URL: http://www.samsungsem.com/kr/support/product-search/mlcc/__icsFiles/afieldfile/2016/08/18/S_CL03C2R7CA3GNNC.pdf; ComponentLink2Description: Digi-Key Listing; ComponentLink2URL: https://www.digikey.com/product-detail/en/samsung-electro-mechanics-america-inc/CL03C2R7CA3GNNC/1276-1408-2-ND/3887066; Voltage: 25V; Price: 0.0039; Device Package: 0201 (0603 Metric)
footprint CAP 0201/0603
pins: 1, 2

## CL03C3R3BA3GNNC
designator C?, comment 3.3pF
CAP CER 3.3PF 25V C0G/NP0 0201; Part Number: CL03C3R3BA3GNNC; Manufacturer: Samsung Electro-Mechanics; TemperatureRange: -55C ~ 125C; TemperatureCoefficient: C0G, NP0; Tolerance: 0.1pF; Value: 3.3pF; PartId: 30158; Supplier 1: Digi-Key; Supplier Part Number 1: 1276-1411-2-ND; ComponentLink1Description: Datasheet; ComponentLink1URL: http://www.samsungsem.com/kr/support/product-search/mlcc/CL03C3R3BA3GNNC.jsp; ComponentLink2Description: Digi-Key Listing; ComponentLink2URL: https://www.digikey.com/product-detail/en/samsung-electro-mechanics/CL03C3R3BA3GNNC/1276-1411-2-ND/3887069; Voltage: 25V; Price: 0; Device Package: 0201 (0603 Metric)
footprint CAP 0201/0603
pins: 1, 2

## CL03C3R3CA3GNNC
designator C?, comment 3.3pF
CAP CER 3.3PF 25V NP0 0201; Part Number: CL03C3R3CA3GNNC; Manufacturer: Samsung Electro-Mechanics America, Inc.; TemperatureRange: -55C ~ 125C; TemperatureCoefficient: C0G, NP0; Tolerance: 0.25pF; Value: 3.3pF; PartId: 21084; Supplier 1: Digi-Key; Supplier Part Number 1: 1276-1412-2-ND; ComponentLink1Description: Datasheet; ComponentLink1URL: http://www.samsungsem.com/kr/support/product-search/mlcc/__icsFiles/afieldfile/2016/08/18/S_CL03C3R3CA3GNNC.pdf; ComponentLink2Description: Digi-Key Listing; ComponentLink2URL: https://www.digikey.com/product-detail/en/samsung-electro-mechanics-america-inc/CL03C3R3CA3GNNC/1276-1412-2-ND/3887070; Voltage: 25V; Price: 0.0039; Device Package: 0201 (0603 Metric)
footprint CAP 0201/0603
pins: 1, 2

## CL03C3R6BA3GNNC
designator C?, comment 3.6pF
CAP CER 3.6PF 25V NP0 0201; Part Number: CL03C3R6BA3GNNC; Manufacturer: Samsung Electro-Mechanics America, Inc.; TemperatureRange: -55C ~ 125C; TemperatureCoefficient: C0G, NP0; Tolerance: 0.1pF; Value: 3.6pF; PartId: 21065; Supplier 1: Digi-Key; Supplier Part Number 1: 1276-1413-2-ND; ComponentLink1Description: Datasheet; ComponentLink1URL: http://www.samsungsem.com/kr/support/product-search/mlcc/__icsFiles/afieldfile/2016/08/18/S_CL03C3R6BA3GNNC.pdf; ComponentLink2Description: Digi-Key Listing; ComponentLink2URL: https://www.digikey.com/product-detail/en/samsung-electro-mechanics-america-inc/CL03C3R6BA3GNNC/1276-1413-2-ND/3887071; Voltage: 25V; Price: 0.0063; Device Package: 0201 (0603 Metric)
footprint CAP 0201/0603
pins: 1, 2

## CL03C3R9BA3GNNC
designator C?, comment 3.9pF
CAP CER 3.9PF 25V NP0 0201; Part Number: CL03C3R9BA3GNNC; Manufacturer: Samsung Electro-Mechanics America, Inc.; TemperatureRange: -55C ~ 125C; TemperatureCoefficient: C0G, NP0; Tolerance: 0.1pF; Value: 3.9pF; PartId: 20790; Supplier 1: Digi-Key; Supplier Part Number 1: 1276-1416-2-ND; ComponentLink1Description: Datasheet; ComponentLink1URL: http://www.samsungsem.com/kr/support/product-search/mlcc/__icsFiles/afieldfile/2016/08/18/S_CL03C3R9BA3GNNC.pdf; ComponentLink2Description: Digi-Key Listing; ComponentLink2URL: https://www.digikey.com/product-detail/en/samsung-electro-mechanics-america-inc/CL03C3R9BA3GNNC/1276-1416-2-ND/3887074; Voltage: 25V; Price: 0.0063; Device Package: 0201 (0603 Metric)
footprint CAP 0201/0603
pins: 1, 2

## CL03C3R9CA3GNNC
designator C?, comment 3.9pF
CAP CER 3.9PF 25V NP0 0201; Part Number: CL03C3R9CA3GNNC; Manufacturer: Samsung Electro-Mechanics America, Inc.; TemperatureRange: -55C ~ 125C; TemperatureCoefficient: C0G, NP0; Tolerance: 0.25pF; Value: 3.9pF; PartId: 20865; Supplier 1: Digi-Key; Supplier Part Number 1: 1276-1417-2-ND; ComponentLink1Description: Datasheet; ComponentLink1URL: http://www.samsungsem.com/kr/support/product-search/mlcc/__icsFiles/afieldfile/2016/08/18/S_CL03C3R9CA3GNNC.pdf; ComponentLink2Description: Digi-Key Listing; ComponentLink2URL: https://www.digikey.com/product-detail/en/samsung-electro-mechanics-america-inc/CL03C3R9CA3GNNC/1276-1417-2-ND/3887075; Voltage: 25V; Price: 0.0039; Device Package: 0201 (0603 Metric)
footprint CAP 0201/0603
pins: 1, 2

## CL03C4R3CA3GNNC
designator C?, comment 4.3pF
CAP CER 4.3PF 25V NP0 0201; Part Number: CL03C4R3CA3GNNC; Manufacturer: Samsung Electro-Mechanics America, Inc.; TemperatureRange: -55C ~ 125C; TemperatureCoefficient: C0G, NP0; Tolerance: 0.25pF; Value: 4.3pF; PartId: 21047; Supplier 1: Digi-Key; Supplier Part Number 1: 1276-1420-2-ND; ComponentLink1Description: Datasheet; ComponentLink1URL: http://www.samsungsem.com/kr/support/product-search/mlcc/__icsFiles/afieldfile/2016/08/18/S_CL03C4R3CA3GNNC.pdf; ComponentLink2Description: Digi-Key Listing; ComponentLink2URL: https://www.digikey.com/product-detail/en/samsung-electro-mechanics-america-inc/CL03C4R3CA3GNNC/1276-1420-2-ND/3887078; Voltage: 25V; Price: 0.0033; Device Package: 0201 (0603 Metric)
footprint CAP 0201/0603
pins: 1, 2

## CL03C4R7BA3GNNC
designator C?, comment 4.7pF
CAP CER 4.7PF 25V NP0 0201; Part Number: CL03C4R7BA3GNNC; Manufacturer: Samsung Electro-Mechanics America, Inc.; TemperatureRange: -55C ~ 125C; TemperatureCoefficient: C0G, NP0; Tolerance: 0.1pF; Value: 4.7pF; PartId: 21029; Supplier 1: Digi-Key; Supplier Part Number 1: 1276-1421-2-ND; ComponentLink1Description: Datasheet; ComponentLink1URL: http://www.samsungsem.com/kr/support/product-search/mlcc/__icsFiles/afieldfile/2016/08/18/S_CL03C4R7BA3GNNC.pdf; ComponentLink2Description: Digi-Key Listing; ComponentLink2URL: https://www.digikey.com/product-detail/en/samsung-electro-mechanics-america-inc/CL03C4R7BA3GNNC/1276-1421-2-ND/3887079; Voltage: 25V; Price: 0.0063; Device Package: 0201 (0603 Metric)
footprint CAP 0201/0603
pins: 1, 2

## CL03C4R7CA3GNNC
designator C?, comment 4.7pF
CAP CER 4.7PF 25V NP0 0201; Part Number: CL03C4R7CA3GNNC; Manufacturer: Samsung Electro-Mechanics America, Inc.; TemperatureRange: -55C ~ 125C; TemperatureCoefficient: C0G, NP0; Tolerance: 0.25pF; Value: 4.7pF; PartId: 21032; Supplier 1: Digi-Key; Supplier Part Number 1: 1276-1422-2-ND; ComponentLink1Description: Datasheet; ComponentLink1URL: http://www.samsungsem.com/kr/support/product-search/mlcc/__icsFiles/afieldfile/2016/08/18/S_CL03C4R7CA3GNNC.pdf; ComponentLink2Description: Digi-Key Listing; ComponentLink2URL: https://www.digikey.com/product-detail/en/samsung-electro-mechanics-america-inc/CL03C4R7CA3GNNC/1276-1422-2-ND/3887080; Voltage: 25V; Price: 0.0039; Device Package: 0201 (0603 Metric)
footprint CAP 0201/0603
pins: 1, 2

## CL03C5R1BA3GNNC
designator C?, comment 5.1pF
CAP CER 5.1PF 25V NP0 0201; Part Number: CL03C5R1BA3GNNC; Manufacturer: Samsung Electro-Mechanics America, Inc.; TemperatureRange: -55C ~ 125C; TemperatureCoefficient: C0G, NP0; Tolerance: 0.1pF; Value: 5.1pF; PartId: 21054; Supplier 1: Digi-Key; Supplier Part Number 1: 1276-1424-2-ND; ComponentLink1Description: Datasheet; ComponentLink1URL: http://www.samsungsem.com/kr/support/product-search/mlcc/__icsFiles/afieldfile/2016/08/18/S_CL03C5R1BA3GNNC.pdf; ComponentLink2Description: Digi-Key Listing; ComponentLink2URL: https://www.digikey.com/product-detail/en/samsung-electro-mechanics-america-inc/CL03C5R1BA3GNNC/1276-1424-2-ND/3887082; Voltage: 25V; Price: 0.0035; Device Package: 0201 (0603 Metric)
footprint CAP 0201/0603
pins: 1, 2

## CL03C5R1CA3GNNC
designator C?, comment 5.1pF
CAP CER 5.1PF 25V NP0 0201; Part Number: CL03C5R1CA3GNNC; Manufacturer: Samsung Electro-Mechanics America, Inc.; TemperatureRange: -55C ~ 125C; TemperatureCoefficient: C0G, NP0; Tolerance: 0.25pF; Value: 5.1pF; PartId: 21031; Supplier 1: Digi-Key; Supplier Part Number 1: 1276-1425-2-ND; ComponentLink1Description: Datasheet; ComponentLink1URL: http://www.samsungsem.com/kr/support/product-search/mlcc/__icsFiles/afieldfile/2016/08/18/S_CL03C5R1CA3GNNC.pdf; ComponentLink2Description: Digi-Key Listing; ComponentLink2URL: https://www.digikey.com/product-detail/en/samsung-electro-mechanics-america-inc/CL03C5R1CA3GNNC/1276-1425-2-ND/3887083; Voltage: 25V; Price: 0.0033; Device Package: 0201 (0603 Metric)
footprint CAP 0201/0603
pins: 1, 2

## CL03C5R6CA3GNNC
designator C?, comment 5.6pF
CAP CER 5.6PF 25V NP0 0201; Part Number: CL03C5R6CA3GNNC; Manufacturer: Samsung Electro-Mechanics America, Inc.; TemperatureRange: -55C ~ 125C; TemperatureCoefficient: C0G, NP0; Tolerance: 0.25pF; Value: 5.6pF; PartId: 20866; Supplier 1: Digi-Key; Supplier Part Number 1: 1276-1427-2-ND; ComponentLink1Description: Datasheet; ComponentLink1URL: //media.digikey.com/pdf/Data%20Sheets/Samsung%20PDFs/CL03C5R6CA3GNNC.pdf; ComponentLink2Description: Digi-Key Listing; ComponentLink2URL: https://www.digikey.com/product-detail/en/samsung-electro-mechanics-america-inc/CL03C5R6CA3GNNC/1276-1427-2-ND/3887085; Voltage: 25V; Price: 0.0039; Device Package: 0201 (0603 Metric)
footprint CAP 0201/0603
pins: 1, 2

## CL03C6R2BA3GNNC
designator C?, comment 6.2pF